# Altium schematic symbol library jlcpcb_2025_04_inductors_extended_0603.schlib: 1269 symbols (part 7 of 7) (continued)
## VHF160808H8N2ST
designator L?  Inductance: 8.2nH
Inductor, 8.2nH, 350mΩ, 400mA, SMD 0603; Manufacturer: FH(Guangdong Fenghua Advanced Tech); Manufacturer Part Number: VHF160808H8N2ST; Package Size: 0603; JLCPCB Basic Part: No; JLCPCB Part Number: C139273; Supplier 1: LCSC; Category: Inductors; Supplier Part Number 1: C139273; Rated Current: 400mA; DC Resistance: 350mΩ; RoHS: Yes; ComponentLink1Description: Datasheet; ComponentLink1URL: https://wmsc.lcsc.com/wmsc/upload/file/pdf/v2/lcsc/2302231230_FH--Guangdong-Fenghua-Advanced-Tech-VHF160808H8N2ST_C139273.pdf; ComponentLink2Description: JLCPCB Part URL; ComponentLink2URL: https://jlcpcb.com/partdetail/C139273; ComponentLink3Description: LCSC Part URL; ComponentLink3URL: https://lcsc.com/product-detail/Inductors-SMD_FH-Guangdong-Fenghua-Advanced-Tech-FH-Guangdong-Fenghua-Advanced-Tech-VHF160808H8N2ST_C139273.html
footprint IND-0603 (0603 (1608M) Inductor)
pins: 1, 2

## VHF160808H9N1JT
designator L?  Inductance: 9.1nH
Inductor, 9.1nH, ±5%, SMD 0603; Manufacturer: FH(Guangdong Fenghua Advanced Tech); Manufacturer Part Number: VHF160808H9N1JT; Package Size: 0603; JLCPCB Basic Part: No; JLCPCB Part Number: C395094; Supplier 1: LCSC; Category: Inductors; Supplier Part Number 1: C395094; Tolerance: ±5%; RoHS: Yes; ComponentLink1Description: Datasheet; ComponentLink1URL: https://wmsc.lcsc.com/wmsc/upload/file/pdf/v2/lcsc/2302231208_FH--Guangdong-Fenghua-Advanced-Tech-VHF160808H9N1JT_C395094.pdf; ComponentLink2Description: JLCPCB Part URL; ComponentLink2URL: https://jlcpcb.com/partdetail/C395094; ComponentLink3Description: LCSC Part URL; ComponentLink3URL: https://lcsc.com/product-detail/Inductors-SMD_FH-Guangdong-Fenghua-Advanced-Tech-FH-Guangdong-Fenghua-Advanced-Tech-VHF160808H9N1JT_C395094.html
footprint IND-0603 (0603 (1608M) Inductor)
pins: 1, 2

## VHF160808H10NJT
designator L?  Inductance: 10nH
Inductor, 10nH, ±5%, 400mΩ, 300mA, SMD 0603; Manufacturer: FH(Guangdong Fenghua Advanced Tech); Manufacturer Part Number: VHF160808H10NJT; Package Size: 0603; JLCPCB Basic Part: No; JLCPCB Part Number: C90205; Supplier 1: LCSC; Category: Inductors; Supplier Part Number 1: C90205; Tolerance: ±5%; Rated Current: 300mA; DC Resistance: 400mΩ; RoHS: Yes; ComponentLink1Description: Datasheet; ComponentLink1URL: https://wmsc.lcsc.com/wmsc/upload/file/pdf/v2/lcsc/2302231230_FH--Guangdong-Fenghua-Advanced-Tech-VHF160808H10NJT_C90205.pdf; ComponentLink2Description: JLCPCB Part URL; ComponentLink2URL: https://jlcpcb.com/partdetail/C90205; ComponentLink3Description: LCSC Part URL; ComponentLink3URL: https://lcsc.com/product-detail/Inductors-SMD_FH-Guangdong-Fenghua-Advanced-Tech-FH-Guangdong-Fenghua-Advanced-Tech-VHF160808H10NJT_C90205.html
footprint IND-0603 (0603 (1608M) Inductor)
pins: 1, 2

## VHF160808H12NJT
designator L?  Inductance: 12nH
Inductor, 12nH, ±5%, 400mΩ, 300mA, SMD 0603; Manufacturer: FH(Guangdong Fenghua Advanced Tech); Manufacturer Part Number: VHF160808H12NJT; Package Size: 0603; JLCPCB Basic Part: No; JLCPCB Part Number: C75656; Supplier 1: LCSC; Category: Inductors; Supplier Part Number 1: C75656; Tolerance: ±5%; Rated Current: 300mA; DC Resistance: 400mΩ; RoHS: Yes; ComponentLink1Description: Datasheet; ComponentLink1URL: https://wmsc.lcsc.com/wmsc/upload/file/pdf/v2/lcsc/2302231101_FH--Guangdong-Fenghua-Advanced-Tech-VHF160808H12NJT_C75656.pdf; ComponentLink2Description: JLCPCB Part URL; ComponentLink2URL: https://jlcpcb.com/partdetail/C75656; ComponentLink3Description: LCSC Part URL; ComponentLink3URL: https://lcsc.com/product-detail/Inductors-SMD_FH-Guangdong-Fenghua-Advanced-Tech-FH-Guangdong-Fenghua-Advanced-Tech-VHF160808H12NJT_C75656.html
footprint IND-0603 (0603 (1608M) Inductor)
pins: 1, 2

## VHF160808H15NJT
designator L?  Inductance: 15nH
Inductor, 15nH, ±5%, 450mΩ, 300mA, SMD 0603; Manufacturer: FH(Guangdong Fenghua Advanced Tech); Manufacturer Part Number: VHF160808H15NJT; Package Size: 0603; JLCPCB Basic Part: No; JLCPCB Part Number: C42028; Supplier 1: LCSC; Category: Inductors; Supplier Part Number 1: C42028; Tolerance: ±5%; Rated Current: 300mA; DC Resistance: 450mΩ; RoHS: Yes; ComponentLink1Description: Datasheet; ComponentLink1URL: https://wmsc.lcsc.com/wmsc/upload/file/pdf/v2/lcsc/2302231300_FH--Guangdong-Fenghua-Advanced-Tech-VHF160808H15NJT_C42028.pdf; ComponentLink2Description: JLCPCB Part URL; ComponentLink2URL: https://jlcpcb.com/partdetail/C42028; ComponentLink3Description: LCSC Part URL; ComponentLink3URL: https://lcsc.com/product-detail/Inductors-SMD_FH-Guangdong-Fenghua-Advanced-Tech-FH-Guangdong-Fenghua-Advanced-Tech-VHF160808H15NJT_C42028.html
footprint IND-0603 (0603 (1608M) Inductor)
pins: 1, 2

## VHF160808H18NJT
designator L?  Inductance: 18nH
Inductor, 18nH, ±5%, 600mΩ, 300mA, SMD 0603; Manufacturer: FH(Guangdong Fenghua Advanced Tech); Manufacturer Part Number: VHF160808H18NJT; Package Size: 0603; JLCPCB Basic Part: No; JLCPCB Part Number: C90206; Supplier 1: LCSC; Category: Inductors; Supplier Part Number 1: C90206; Tolerance: ±5%; Rated Current: 300mA; DC Resistance: 600mΩ; RoHS: Yes; ComponentLink1Description: Datasheet; ComponentLink1URL: https://wmsc.lcsc.com/wmsc/upload/file/pdf/v2/lcsc/2302231230_FH--Guangdong-Fenghua-Advanced-Tech-VHF160808H18NJT_C90206.pdf; ComponentLink2Description: JLCPCB Part URL; ComponentLink2URL: https://jlcpcb.com/partdetail/C90206; ComponentLink3Description: LCSC Part URL; ComponentLink3URL: https://lcsc.com/product-detail/Inductors-SMD_FH-Guangdong-Fenghua-Advanced-Tech-FH-Guangdong-Fenghua-Advanced-Tech-VHF160808H18NJT_C90206.html
footprint IND-0603 (0603 (1608M) Inductor)
pins: 1, 2

## VHF160808H20NJT
designator L?  Inductance: 20nH
Inductor, 20nH, ±5%, 300mA, SMD 0603; Manufacturer: FH (Guangdong Fenghua Advanced Tech); Manufacturer Part Number: VHF160808H20NJT; Package Size: 0603; JLCPCB Basic Part: No; JLCPCB Part Number: C395080; Supplier 1: LCSC; Category: Inductors; Supplier Part Number 1: C395080; Tolerance: ±5%; Rated Current: 300mA; RoHS: Yes; ComponentLink1Description: Datasheet; ComponentLink1URL: https://wmsc.lcsc.com/wmsc/upload/file/pdf/v2/lcsc/2302231208_FH--Guangdong-Fenghua-Advanced-Tech-VHF160808H20NJT_C395080.pdf; ComponentLink2Description: JLCPCB Part URL; ComponentLink2URL: https://jlcpcb.com/partdetail/C395080; ComponentLink3Description: LCSC Part URL; ComponentLink3URL: https://lcsc.com/product-detail/Inductors-SMD_FH-Guangdong-Fenghua-Advanced-Tech-FH-Guangdong-Fenghua-Advanced-Tech-VHF160808H20NJT_C395080.html
footprint IND-0603 (0603 (1608M) Inductor)
pins: 1, 2

## VHF160808H22NJT
designator L?  Inductance: 22nH
Inductor, 22nH, ±5%, 600mΩ, 300mA, SMD 0603; Manufacturer: FH(Guangdong Fenghua Advanced Tech); Manufacturer Part Number: VHF160808H22NJT; Package Size: 0603; JLCPCB Basic Part: No; JLCPCB Part Number: C90207; Supplier 1: LCSC; Category: Inductors; Supplier Part Number 1: C90207; Tolerance: ±5%; Rated Current: 300mA; DC Resistance: 600mΩ; RoHS: Yes; ComponentLink1Description: Datasheet; ComponentLink1URL: https://wmsc.lcsc.com/wmsc/upload/file/pdf/v2/lcsc/2302231230_FH--Guangdong-Fenghua-Advanced-Tech-VHF160808H22NJT_C90207.pdf; ComponentLink2Description: JLCPCB Part URL; ComponentLink2URL: https://jlcpcb.com/partdetail/C90207; ComponentLink3Description: LCSC Part URL; ComponentLink3URL: https://lcsc.com/product-detail/Inductors-SMD_FH-Guangdong-Fenghua-Advanced-Tech-FH-Guangdong-Fenghua-Advanced-Tech-VHF160808H22NJT_C90207.html
footprint IND-0603 (0603 (1608M) Inductor)
pins: 1, 2

## VHF160808H24NJT
designator L?  Inductance: 24nH
Inductor, 24nH, ±5%, SMD 0603; Manufacturer: FH(Guangdong Fenghua Advanced Tech); Manufacturer Part Number: VHF160808H24NJT; Package Size: 0603; JLCPCB Basic Part: No; JLCPCB Part Number: C139271; Supplier 1: LCSC; Category: Inductors; Supplier Part Number 1: C139271; Tolerance: ±5%; RoHS: Yes; ComponentLink1Description: Datasheet; ComponentLink1URL: https://wmsc.lcsc.com/wmsc/upload/file/pdf/v2/lcsc/2302231230_FH--Guangdong-Fenghua-Advanced-Tech-VHF160808H24NJT_C139271.pdf; ComponentLink2Description: JLCPCB Part URL; ComponentLink2URL: https://jlcpcb.com/partdetail/C139271; ComponentLink3Description: LCSC Part URL; ComponentLink3URL: https://lcsc.com/product-detail/Inductors-SMD_FH-Guangdong-Fenghua-Advanced-Tech-FH-Guangdong-Fenghua-Advanced-Tech-VHF160808H24NJT_C139271.html
footprint IND-0603 (0603 (1608M) Inductor)
pins: 1, 2

## VHF160808H27NJT
designator L?  Inductance: 27nH
Inductor, 27nH, ±5%, 800mΩ, 300mA, SMD 0603; Manufacturer: FH(Guangdong Fenghua Advanced Tech); Manufacturer Part Number: VHF160808H27NJT; Package Size: 0603; JLCPCB Basic Part: No; JLCPCB Part Number: C90208; Supplier 1: LCSC; Category: Inductors; Supplier Part Number 1: C90208; Tolerance: ±5%; Rated Current: 300mA; DC Resistance: 800mΩ; RoHS: Yes; ComponentLink1Description: Datasheet; ComponentLink1URL: https://wmsc.lcsc.com/wmsc/upload/file/pdf/v2/lcsc/2302231230_FH--Guangdong-Fenghua-Advanced-Tech-VHF160808H27NJT_C90208.pdf; ComponentLink2Description: JLCPCB Part URL; ComponentLink2URL: https://jlcpcb.com/partdetail/C90208; ComponentLink3Description: LCSC Part URL; ComponentLink3URL: https://lcsc.com/product-detail/Inductors-SMD_FH-Guangdong-Fenghua-Advanced-Tech-FH-Guangdong-Fenghua-Advanced-Tech-VHF160808H27NJT_C90208.html
footprint IND-0603 (0603 (1608M) Inductor)
pins: 1, 2

## VHF160808H30NJT
designator L?  Inductance: 30nH
Inductor, 30nH, ±5%, 300mA, SMD 0603; Manufacturer: FH (Guangdong Fenghua Advanced Tech); Manufacturer Part Number: VHF160808H30NJT; Package Size: 0603; JLCPCB Basic Part: No; JLCPCB Part Number: C395083; Supplier 1: LCSC; Category: Inductors; Supplier Part Number 1: C395083; Tolerance: ±5%; Rated Current: 300mA; RoHS: Yes; ComponentLink1Description: Datasheet; ComponentLink1URL: https://wmsc.lcsc.com/wmsc/upload/file/pdf/v2/lcsc/2302231208_FH--Guangdong-Fenghua-Advanced-Tech-VHF160808H30NJT_C395083.pdf; ComponentLink2Description: JLCPCB Part URL; ComponentLink2URL: https://jlcpcb.com/partdetail/C395083; ComponentLink3Description: LCSC Part URL; ComponentLink3URL: https://lcsc.com/product-detail/Inductors-SMD_FH-Guangdong-Fenghua-Advanced-Tech-FH-Guangdong-Fenghua-Advanced-Tech-VHF160808H30NJT_C395083.html
footprint IND-0603 (0603 (1608M) Inductor)
pins: 1, 2

## VHF160808H33NJT
designator L?  Inductance: 33nH
Inductor, 33nH, ±5%, 800mΩ, 300mA, SMD 0603; Manufacturer: FH(Guangdong Fenghua Advanced Tech); Manufacturer Part Number: VHF160808H33NJT; Package Size: 0603; JLCPCB Basic Part: No; JLCPCB Part Number: C90209; Supplier 1: LCSC; Category: Inductors; Supplier Part Number 1: C90209; Tolerance: ±5%; Rated Current: 300mA; DC Resistance: 800mΩ; RoHS: Yes; ComponentLink1Description: Datasheet; ComponentLink1URL: https://wmsc.lcsc.com/wmsc/upload/file/pdf/v2/lcsc/2302231230_FH--Guangdong-Fenghua-Advanced-Tech-VHF160808H33NJT_C90209.pdf; ComponentLink2Description: JLCPCB Part URL; ComponentLink2URL: https://jlcpcb.com/partdetail/C90209; ComponentLink3Description: LCSC Part URL; ComponentLink3URL: https://lcsc.com/product-detail/Inductors-SMD_FH-Guangdong-Fenghua-Advanced-Tech-FH-Guangdong-Fenghua-Advanced-Tech-VHF160808H33NJT_C90209.html
footprint IND-0603 (0603 (1608M) Inductor)
pins: 1, 2

## VHF160808H36NJT
designator L?  Inductance: 36nH
Inductor, 36nH, ±5%, SMD 0603; Manufacturer: FH(Guangdong Fenghua Advanced Tech); Manufacturer Part Number: VHF160808H36NJT; Package Size: 0603; JLCPCB Basic Part: No; JLCPCB Part Number: C395084; Supplier 1: LCSC; Category: Inductors; Supplier Part Number 1: C395084; Tolerance: ±5%; RoHS: Yes; ComponentLink1Description: Datasheet; ComponentLink1URL: https://wmsc.lcsc.com/wmsc/upload/file/pdf/v2/lcsc/2302231208_FH--Guangdong-Fenghua-Advanced-Tech-VHF160808H36NJT_C395084.pdf; ComponentLink2Description: JLCPCB Part URL; ComponentLink2URL: https://jlcpcb.com/partdetail/C395084; ComponentLink3Description: LCSC Part URL; ComponentLink3URL: https://lcsc.com/product-detail/Inductors-SMD_FH-Guangdong-Fenghua-Advanced-Tech-FH-Guangdong-Fenghua-Advanced-Tech-VHF160808H36NJT_C395084.html
footprint IND-0603 (0603 (1608M) Inductor)
pins: 1, 2

## VHF160808H39NJT
designator L?  Inductance: 39nH
Inductor, 39nH, ±5%, 1Ω, 300mA, SMD 0603; Manufacturer: FH(Guangdong Fenghua Advanced Tech); Manufacturer Part Number: VHF160808H39NJT; Package Size: 0603; JLCPCB Basic Part: No; JLCPCB Part Number: C75654; Supplier 1: LCSC; Category: Inductors; Supplier Part Number 1: C75654; Tolerance: ±5%; Rated Current: 300mA; DC Resistance: 1Ω; RoHS: Yes; ComponentLink1Description: Datasheet; ComponentLink1URL: https://wmsc.lcsc.com/wmsc/upload/file/pdf/v2/lcsc/2302231101_FH--Guangdong-Fenghua-Advanced-Tech-VHF160808H39NJT_C75654.pdf; ComponentLink2Description: JLCPCB Part URL; ComponentLink2URL: https://jlcpcb.com/partdetail/C75654; ComponentLink3Description: LCSC Part URL; ComponentLink3URL: https://lcsc.com/product-detail/Inductors-SMD_FH-Guangdong-Fenghua-Advanced-Tech-FH-Guangdong-Fenghua-Advanced-Tech-VHF160808H39NJT_C75654.html
footprint IND-0603 (0603 (1608M) Inductor)
pins: 1, 2

## VHF160808H43NJT
designator L?  Inductance: 43nH
Inductor, 43nH, ±5%, 200mA, SMD 0603; Manufacturer: FH (Guangdong Fenghua Advanced Tech); Manufacturer Part Number: VHF160808H43NJT; Package Size: 0603; JLCPCB Basic Part: No; JLCPCB Part Number: C395087; Supplier 1: LCSC; Category: Inductors; Supplier Part Number 1: C395087; Tolerance: ±5%; Rated Current: 200mA; RoHS: Yes; ComponentLink1Description: Datasheet; ComponentLink1URL: https://wmsc.lcsc.com/wmsc/upload/file/pdf/v2/lcsc/2302231208_FH--Guangdong-Fenghua-Advanced-Tech-VHF160808H43NJT_C395087.pdf; ComponentLink2Description: JLCPCB Part URL; ComponentLink2URL: https://jlcpcb.com/partdetail/C395087; ComponentLink3Description: LCSC Part URL; ComponentLink3URL: https://lcsc.com/product-detail/Inductors-SMD_FH-Guangdong-Fenghua-Advanced-Tech-FH-Guangdong-Fenghua-Advanced-Tech-VHF160808H43NJT_C395087.html
footprint IND-0603 (0603 (1608M) Inductor)
pins: 1, 2

## VHF160808H47NJT
designator L?  Inductance: 47nH
Inductor, 47nH, ±5%, 1Ω, 200mA, SMD 0603; Manufacturer: FH(Guangdong Fenghua Advanced Tech); Manufacturer Part Number: VHF160808H47NJT; Package Size: 0603; JLCPCB Basic Part: No; JLCPCB Part Number: C90210; Supplier 1: LCSC; Category: Inductors; Supplier Part Number 1: C90210; Tolerance: ±5%; Rated Current: 200mA; DC Resistance: 1Ω; RoHS: Yes; ComponentLink1Description: Datasheet; ComponentLink1URL: https://wmsc.lcsc.com/wmsc/upload/file/pdf/v2/lcsc/2302231230_FH--Guangdong-Fenghua-Advanced-Tech-VHF160808H47NJT_C90210.pdf; ComponentLink2Description: JLCPCB Part URL; ComponentLink2URL: https://jlcpcb.com/partdetail/C90210; ComponentLink3Description: LCSC Part URL; ComponentLink3URL: https://lcsc.com/product-detail/Inductors-SMD_FH-Guangdong-Fenghua-Advanced-Tech-FH-Guangdong-Fenghua-Advanced-Tech-VHF160808H47NJT_C90210.html
footprint IND-0603 (0603 (1608M) Inductor)
pins: 1, 2

## VHF160808H51NJT
designator L?  Inductance: 51nH
Inductor, 51nH, ±5%, SMD 0603; Manufacturer: FH (Guangdong Fenghua Advanced Tech); Manufacturer Part Number: VHF160808H51NJT; Package Size: 0603; JLCPCB Basic Part: No; JLCPCB Part Number: C2991178; Supplier 1: LCSC; Category: Inductors; Supplier Part Number 1: C2991178; Tolerance: ±5%; RoHS: Yes; ComponentLink1Description: Datasheet; ComponentLink1URL: https://wmsc.lcsc.com/wmsc/upload/file/pdf/v2/lcsc/2302231130_FH--Guangdong-Fenghua-Advanced-Tech-VHF160808H51NJT_C2991178.pdf; ComponentLink2Description: JLCPCB Part URL; ComponentLink2URL: https://jlcpcb.com/partdetail/C2991178; ComponentLink3Description: LCSC Part URL; ComponentLink3URL: https://lcsc.com/product-detail/Inductors-SMD_FH-Guangdong-Fenghua-Advanced-Tech-FH-Guangdong-Fenghua-Advanced-Tech-VHF160808H51NJT_C2991178.html
footprint IND-0603 (0603 (1608M) Inductor)
pins: 1, 2

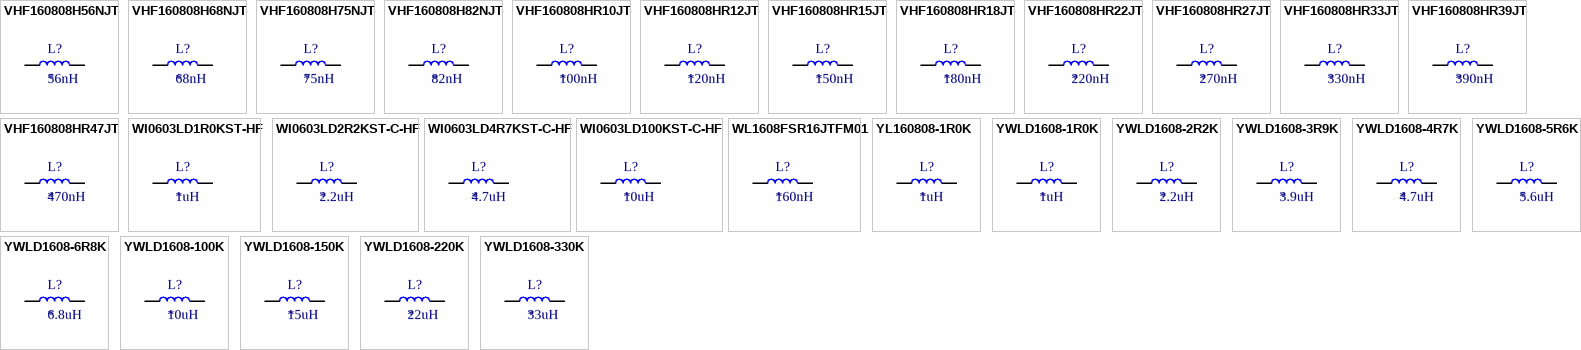
[diagram p31: symbols VHF160808H56NJT to YWLD1608-330K]

## VHF160808H56NJT
designator L?  Inductance: 56nH
Inductor, 56nH, ±5%, 1Ω, 200mA, SMD 0603; Manufacturer: FH(Guangdong Fenghua Advanced Tech); Manufacturer Part Number: VHF160808H56NJT; Package Size: 0603; JLCPCB Basic Part: No; JLCPCB Part Number: C90211; Supplier 1: LCSC; Category: Inductors; Supplier Part Number 1: C90211; Tolerance: ±5%; Rated Current: 200mA; DC Resistance: 1Ω; RoHS: Yes; ComponentLink1Description: Datasheet; ComponentLink1URL: https://wmsc.lcsc.com/wmsc/upload/file/pdf/v2/lcsc/2302231230_FH--Guangdong-Fenghua-Advanced-Tech-VHF160808H56NJT_C90211.pdf; ComponentLink2Description: JLCPCB Part URL; ComponentLink2URL: https://jlcpcb.com/partdetail/C90211; ComponentLink3Description: LCSC Part URL; ComponentLink3URL: https://lcsc.com/product-detail/Inductors-SMD_FH-Guangdong-Fenghua-Advanced-Tech-FH-Guangdong-Fenghua-Advanced-Tech-VHF160808H56NJT_C90211.html
footprint IND-0603 (0603 (1608M) Inductor)
pins: 1, 2

## VHF160808H68NJT
designator L?  Inductance: 68nH
Inductor, 68nH, ±5%, 1Ω, 200mA, SMD 0603; Manufacturer: FH(Guangdong Fenghua Advanced Tech); Manufacturer Part Number: VHF160808H68NJT; Package Size: 0603; JLCPCB Basic Part: No; JLCPCB Part Number: C90212; Supplier 1: LCSC; Category: Inductors; Supplier Part Number 1: C90212; Tolerance: ±5%; Rated Current: 200mA; DC Resistance: 1Ω; RoHS: Yes; ComponentLink1Description: Datasheet; ComponentLink1URL: https://wmsc.lcsc.com/wmsc/upload/file/pdf/v2/lcsc/2302231230_FH--Guangdong-Fenghua-Advanced-Tech-VHF160808H68NJT_C90212.pdf; ComponentLink2Description: JLCPCB Part URL; ComponentLink2URL: https://jlcpcb.com/partdetail/C90212; ComponentLink3Description: LCSC Part URL; ComponentLink3URL: https://lcsc.com/product-detail/Inductors-SMD_FH-Guangdong-Fenghua-Advanced-Tech-FH-Guangdong-Fenghua-Advanced-Tech-VHF160808H68NJT_C90212.html
footprint IND-0603 (0603 (1608M) Inductor)
pins: 1, 2

## VHF160808H75NJT
designator L?  Inductance: 75nH
Inductor, 75nH, ±5%, SMD 0603; Manufacturer: FH(Guangdong Fenghua Advanced Tech); Manufacturer Part Number: VHF160808H75NJT; Package Size: 0603; JLCPCB Basic Part: No; JLCPCB Part Number: C395092; Supplier 1: LCSC; Category: Inductors; Supplier Part Number 1: C395092; Tolerance: ±5%; RoHS: Yes; ComponentLink1Description: Datasheet; ComponentLink1URL: https://wmsc.lcsc.com/wmsc/upload/file/pdf/v2/lcsc/2302231208_FH--Guangdong-Fenghua-Advanced-Tech-VHF160808H75NJT_C395092.pdf; ComponentLink2Description: JLCPCB Part URL; ComponentLink2URL: https://jlcpcb.com/partdetail/C395092; ComponentLink3Description: LCSC Part URL; ComponentLink3URL: https://lcsc.com/product-detail/Inductors-SMD_FH-Guangdong-Fenghua-Advanced-Tech-FH-Guangdong-Fenghua-Advanced-Tech-VHF160808H75NJT_C395092.html
footprint IND-0603 (0603 (1608M) Inductor)
pins: 1, 2

## VHF160808H82NJT
designator L?  Inductance: 82nH
Inductor, 82nH, ±5%, 1Ω, 200mA, SMD 0603; Manufacturer: FH(Guangdong Fenghua Advanced Tech); Manufacturer Part Number: VHF160808H82NJT; Package Size: 0603; JLCPCB Basic Part: No; JLCPCB Part Number: C90213; Supplier 1: LCSC; Category: Inductors; Supplier Part Number 1: C90213; Tolerance: ±5%; Rated Current: 200mA; DC Resistance: 1Ω; RoHS: Yes; ComponentLink1Description: Datasheet; ComponentLink1URL: https://wmsc.lcsc.com/wmsc/upload/file/pdf/v2/lcsc/2302231230_FH--Guangdong-Fenghua-Advanced-Tech-VHF160808H82NJT_C90213.pdf; ComponentLink2Description: JLCPCB Part URL; ComponentLink2URL: https://jlcpcb.com/partdetail/C90213; ComponentLink3Description: LCSC Part URL; ComponentLink3URL: https://lcsc.com/product-detail/Inductors-SMD_FH-Guangdong-Fenghua-Advanced-Tech-FH-Guangdong-Fenghua-Advanced-Tech-VHF160808H82NJT_C90213.html
footprint IND-0603 (0603 (1608M) Inductor)
pins: 1, 2

## VHF160808HR10JT
designator L?  Inductance: 100nH
Inductor, 100nH, ±5%, 1.4Ω, 200mA, SMD 0603; Manufacturer: FH(Guangdong Fenghua Advanced Tech); Manufacturer Part Number: VHF160808HR10JT; Package Size: 0603; JLCPCB Basic Part: No; JLCPCB Part Number: C90214; Supplier 1: LCSC; Category: Inductors; Supplier Part Number 1: C90214; Tolerance: ±5%; Rated Current: 200mA; DC Resistance: 1.4Ω; RoHS: Yes; ComponentLink1Description: Datasheet; ComponentLink1URL: https://wmsc.lcsc.com/wmsc/upload/file/pdf/v2/lcsc/2302231230_FH--Guangdong-Fenghua-Advanced-Tech-VHF160808HR10JT_C90214.pdf; ComponentLink2Description: JLCPCB Part URL; ComponentLink2URL: https://jlcpcb.com/partdetail/C90214; ComponentLink3Description: LCSC Part URL; ComponentLink3URL: https://lcsc.com/product-detail/Inductors-SMD_FH-Guangdong-Fenghua-Advanced-Tech-FH-Guangdong-Fenghua-Advanced-Tech-VHF160808HR10JT_C90214.html
footprint IND-0603 (0603 (1608M) Inductor)
pins: 1, 2

## VHF160808HR12JT
designator L?  Inductance: 120nH
Inductor, 120nH, ±5%, 1.6Ω, 150mA, SMD 0603; Manufacturer: FH(Guangdong Fenghua Advanced Tech); Manufacturer Part Number: VHF160808HR12JT; Package Size: 0603; JLCPCB Basic Part: No; JLCPCB Part Number: C90215; Supplier 1: LCSC; Category: Inductors; Supplier Part Number 1: C90215; Tolerance: ±5%; Rated Current: 150mA; DC Resistance: 1.6Ω; RoHS: Yes; ComponentLink1Description: Datasheet; ComponentLink1URL: https://wmsc.lcsc.com/wmsc/upload/file/pdf/v2/lcsc/2302231230_FH--Guangdong-Fenghua-Advanced-Tech-VHF160808HR12JT_C90215.pdf; ComponentLink2Description: JLCPCB Part URL; ComponentLink2URL: https://jlcpcb.com/partdetail/C90215; ComponentLink3Description: LCSC Part URL; ComponentLink3URL: https://lcsc.com/product-detail/Inductors-SMD_FH-Guangdong-Fenghua-Advanced-Tech-FH-Guangdong-Fenghua-Advanced-Tech-VHF160808HR12JT_C90215.html
footprint IND-0603 (0603 (1608M) Inductor)
pins: 1, 2

## VHF160808HR15JT
designator L?  Inductance: 150nH
Inductor, 150nH, ±5%, 1.8Ω, 150mA, SMD 0603; Manufacturer: FH(Guangdong Fenghua Advanced Tech); Manufacturer Part Number: VHF160808HR15JT; Package Size: 0603; JLCPCB Basic Part: No; JLCPCB Part Number: C90216; Supplier 1: LCSC; Category: Inductors; Supplier Part Number 1: C90216; Tolerance: ±5%; Rated Current: 150mA; DC Resistance: 1.8Ω; RoHS: Yes; ComponentLink1Description: Datasheet; ComponentLink1URL: https://wmsc.lcsc.com/wmsc/upload/file/pdf/v2/lcsc/2302231230_FH--Guangdong-Fenghua-Advanced-Tech-VHF160808HR15JT_C90216.pdf; ComponentLink2Description: JLCPCB Part URL; ComponentLink2URL: https://jlcpcb.com/partdetail/C90216; ComponentLink3Description: LCSC Part URL; ComponentLink3URL: https://lcsc.com/product-detail/Inductors-SMD_FH-Guangdong-Fenghua-Advanced-Tech-FH-Guangdong-Fenghua-Advanced-Tech-VHF160808HR15JT_C90216.html
footprint IND-0603 (0603 (1608M) Inductor)
pins: 1, 2

## VHF160808HR18JT
designator L?  Inductance: 180nH
Inductor, 180nH, ±5%, SMD 0603; Manufacturer: FH(Guangdong Fenghua Advanced Tech); Manufacturer Part Number: VHF160808HR18JT; Package Size: 0603; JLCPCB Basic Part: No; JLCPCB Part Number: C90217; Supplier 1: LCSC; Category: Inductors; Supplier Part Number 1: C90217; Tolerance: ±5%; RoHS: Yes; ComponentLink1Description: Datasheet; ComponentLink1URL: https://wmsc.lcsc.com/wmsc/upload/file/pdf/v2/lcsc/2302231230_FH--Guangdong-Fenghua-Advanced-Tech-VHF160808HR18JT_C90217.pdf; ComponentLink2Description: JLCPCB Part URL; ComponentLink2URL: https://jlcpcb.com/partdetail/C90217; ComponentLink3Description: LCSC Part URL; ComponentLink3URL: https://lcsc.com/product-detail/Inductors-SMD_FH-Guangdong-Fenghua-Advanced-Tech-FH-Guangdong-Fenghua-Advanced-Tech-VHF160808HR18JT_C90217.html
footprint IND-0603 (0603 (1608M) Inductor)
pins: 1, 2

## VHF160808HR22JT
designator L?  Inductance: 220nH
Inductor, 220nH, ±5%, 2.4Ω, 200mA, SMD 0603; Manufacturer: FH(Guangdong Fenghua Advanced Tech); Manufacturer Part Number: VHF160808HR22JT; Package Size: 0603; JLCPCB Basic Part: No; JLCPCB Part Number: C381900; Supplier 1: LCSC; Category: Inductors; Supplier Part Number 1: C381900; Tolerance: ±5%; Rated Current: 200mA; DC Resistance: 2.4Ω; RoHS: Yes; ComponentLink1Description: Datasheet; ComponentLink1URL: https://wmsc.lcsc.com/wmsc/upload/file/pdf/v2/lcsc/2302231208_FH--Guangdong-Fenghua-Advanced-Tech-VHF160808HR22JT_C381900.pdf; ComponentLink2Description: JLCPCB Part URL; ComponentLink2URL: https://jlcpcb.com/partdetail/C381900; ComponentLink3Description: LCSC Part URL; ComponentLink3URL: https://lcsc.com/product-detail/Inductors-SMD_FH-Guangdong-Fenghua-Advanced-Tech-FH-Guangdong-Fenghua-Advanced-Tech-VHF160808HR22JT_C381900.html
footprint IND-0603 (0603 (1608M) Inductor)
pins: 1, 2

## VHF160808HR27JT
designator L?  Inductance: 270nH
Inductor, 270nH, ±5%, 2.6Ω, 150mA, SMD 0603; Manufacturer: FH(Guangdong Fenghua Advanced Tech); Manufacturer Part Number: VHF160808HR27JT; Package Size: 0603; JLCPCB Basic Part: No; JLCPCB Part Number: C381901; Supplier 1: LCSC; Category: Inductors; Supplier Part Number 1: C381901; Tolerance: ±5%; Rated Current: 150mA; DC Resistance: 2.6Ω; RoHS: Yes; ComponentLink1Description: Datasheet; ComponentLink1URL: https://wmsc.lcsc.com/wmsc/upload/file/pdf/v2/lcsc/2302231208_FH--Guangdong-Fenghua-Advanced-Tech-VHF160808HR27JT_C381901.pdf; ComponentLink2Description: JLCPCB Part URL; ComponentLink2URL: https://jlcpcb.com/partdetail/C381901; ComponentLink3Description: LCSC Part URL; ComponentLink3URL: https://lcsc.com/product-detail/Inductors-SMD_FH-Guangdong-Fenghua-Advanced-Tech-FH-Guangdong-Fenghua-Advanced-Tech-VHF160808HR27JT_C381901.html
footprint IND-0603 (0603 (1608M) Inductor)
pins: 1, 2

## VHF160808HR33JT
designator L?  Inductance: 330nH
Inductor, 330nH, ±5%, 2.8Ω, 150mA, SMD 0603; Manufacturer: FH(Guangdong Fenghua Advanced Tech); Manufacturer Part Number: VHF160808HR33JT; Package Size: 0603; JLCPCB Basic Part: No; JLCPCB Part Number: C381902; Supplier 1: LCSC; Category: Inductors; Supplier Part Number 1: C381902; Tolerance: ±5%; Rated Current: 150mA; DC Resistance: 2.8Ω; RoHS: Yes; ComponentLink1Description: Datasheet; ComponentLink1URL: https://wmsc.lcsc.com/wmsc/upload/file/pdf/v2/lcsc/2302231208_FH--Guangdong-Fenghua-Advanced-Tech-VHF160808HR33JT_C381902.pdf; ComponentLink2Description: JLCPCB Part URL; ComponentLink2URL: https://jlcpcb.com/partdetail/C381902; ComponentLink3Description: LCSC Part URL; ComponentLink3URL: https://lcsc.com/product-detail/Inductors-SMD_FH-Guangdong-Fenghua-Advanced-Tech-FH-Guangdong-Fenghua-Advanced-Tech-VHF160808HR33JT_C381902.html
footprint IND-0603 (0603 (1608M) Inductor)
pins: 1, 2

## VHF160808HR39JT
designator L?  Inductance: 390nH
Inductor, 390nH, ±5%, 3.2Ω, 150mA, SMD 0603; Manufacturer: FH(Guangdong Fenghua Advanced Tech); Manufacturer Part Number: VHF160808HR39JT; Package Size: 0603; JLCPCB Basic Part: No; JLCPCB Part Number: C395095; Supplier 1: LCSC; Category: Inductors; Supplier Part Number 1: C395095; Tolerance: ±5%; Rated Current: 150mA; DC Resistance: 3.2Ω; RoHS: Yes; ComponentLink1Description: Datasheet; ComponentLink1URL: https://wmsc.lcsc.com/wmsc/upload/file/pdf/v2/lcsc/2302231208_FH--Guangdong-Fenghua-Advanced-Tech-VHF160808HR39JT_C395095.pdf; ComponentLink2Description: JLCPCB Part URL; ComponentLink2URL: https://jlcpcb.com/partdetail/C395095; ComponentLink3Description: LCSC Part URL; ComponentLink3URL: https://lcsc.com/product-detail/Inductors-SMD_FH-Guangdong-Fenghua-Advanced-Tech-FH-Guangdong-Fenghua-Advanced-Tech-VHF160808HR39JT_C395095.html
footprint IND-0603 (0603 (1608M) Inductor)
pins: 1, 2

## VHF160808HR47JT
designator L?  Inductance: 470nH
Inductor, 470nH, ±5%, 3.6Ω, 150mA, SMD 0603; Manufacturer: FH(Guangdong Fenghua Advanced Tech); Manufacturer Part Number: VHF160808HR47JT; Package Size: 0603; JLCPCB Basic Part: No; JLCPCB Part Number: C395096; Supplier 1: LCSC; Category: Inductors; Supplier Part Number 1: C395096; Tolerance: ±5%; Rated Current: 150mA; DC Resistance: 3.6Ω; RoHS: Yes; ComponentLink1Description: Datasheet; ComponentLink1URL: https://wmsc.lcsc.com/wmsc/upload/file/pdf/v2/lcsc/2302231208_FH--Guangdong-Fenghua-Advanced-Tech-VHF160808HR47JT_C395096.pdf; ComponentLink2Description: JLCPCB Part URL; ComponentLink2URL: https://jlcpcb.com/partdetail/C395096; ComponentLink3Description: LCSC Part URL; ComponentLink3URL: https://lcsc.com/product-detail/Inductors-SMD_FH-Guangdong-Fenghua-Advanced-Tech-FH-Guangdong-Fenghua-Advanced-Tech-VHF160808HR47JT_C395096.html
footprint IND-0603 (0603 (1608M) Inductor)
pins: 1, 2

## WI0603LD1R0KST-HF
designator L?  Inductance: 1uH
Inductor, 1uH, ±10%, 410mΩ, SMD 0603; Manufacturer: DDY; Manufacturer Part Number: WI0603LD1R0KST-HF; Self-Resonant Frequency: 250MHz; Q Factor: 16@7.9MHz; Package Size: 0603; JLCPCB Basic Part: No; JLCPCB Part Number: C2921052; Supplier 1: LCSC; Category: Inductors; Supplier Part Number 1: C2921052; Tolerance: ±10%; DC Resistance: 410mΩ; RoHS: Yes; ComponentLink1Description: Datasheet; ComponentLink1URL: https://wmsc.lcsc.com/wmsc/upload/file/pdf/v2/lcsc/2111172030_DDY-WI0603LD1R0KST-HF_C2921052.pdf; ComponentLink2Description: JLCPCB Part URL; ComponentLink2URL: https://jlcpcb.com/partdetail/C2921052; ComponentLink3Description: LCSC Part URL; ComponentLink3URL: https://lcsc.com/product-detail/Inductors-SMD_DDY-DDY-WI0603LD1R0KST-HF_C2921052.html
footprint IND-0603 (0603 (1608M) Inductor)
pins: 1, 2

## WI0603LD2R2KST-C-HF
designator L?  Inductance: 2.2uH
Inductor, 2.2uH, ±10%, 500mΩ, SMD 0603; Manufacturer: DDY; Manufacturer Part Number: WI0603LD2R2KST-C-HF; Self-Resonant Frequency: 103MHz; Q Factor: 16@7.9MHz; Package Size: 0603; JLCPCB Basic Part: No; JLCPCB Part Number: C2921053; Supplier 1: LCSC; Category: Inductors; Supplier Part Number 1: C2921053; Tolerance: ±10%; DC Resistance: 500mΩ; RoHS: Yes; ComponentLink1Description: Datasheet; ComponentLink1URL: https://wmsc.lcsc.com/wmsc/upload/file/pdf/v2/lcsc/2111172030_DDY-WI0603LD2R2KST-C-HF_C2921053.pdf; ComponentLink2Description: JLCPCB Part URL; ComponentLink2URL: https://jlcpcb.com/partdetail/C2921053; ComponentLink3Description: LCSC Part URL; ComponentLink3URL: https://lcsc.com/product-detail/Inductors-SMD_DDY-DDY-WI0603LD2R2KST-C-HF_C2921053.html
footprint IND-0603 (0603 (1608M) Inductor)
pins: 1, 2

## WI0603LD4R7KST-C-HF
designator L?  Inductance: 4.7uH
Inductor, 4.7uH, ±10%, 970mΩ, SMD 0603; Manufacturer: DDY; Manufacturer Part Number: WI0603LD4R7KST-C-HF; Self-Resonant Frequency: 51MHz; Q Factor: 16@7.9MHz; Package Size: 0603; JLCPCB Basic Part: No; JLCPCB Part Number: C2921054; Supplier 1: LCSC; Category: Inductors; Supplier Part Number 1: C2921054; Tolerance: ±10%; DC Resistance: 970mΩ; RoHS: Yes; ComponentLink1Description: Datasheet; ComponentLink1URL: https://wmsc.lcsc.com/wmsc/upload/file/pdf/v2/lcsc/2111172030_DDY-WI0603LD4R7KST-C-HF_C2921054.pdf; ComponentLink2Description: JLCPCB Part URL; ComponentLink2URL: https://jlcpcb.com/partdetail/C2921054; ComponentLink3Description: LCSC Part URL; ComponentLink3URL: https://lcsc.com/product-detail/Inductors-SMD_DDY-DDY-WI0603LD4R7KST-C-HF_C2921054.html
footprint IND-0603 (0603 (1608M) Inductor)
pins: 1, 2

## WI0603LD100KST-C-HF
designator L?  Inductance: 10uH
Inductor, 10uH, ±10%, 2.4Ω, SMD 0603; Manufacturer: DDY; Manufacturer Part Number: WI0603LD100KST-C-HF; Self-Resonant Frequency: 36MHz; Q Factor: 14@2.5MHz; Package Size: 0603; JLCPCB Basic Part: No; JLCPCB Part Number: C2921055; Supplier 1: LCSC; Category: Inductors; Supplier Part Number 1: C2921055; Tolerance: ±10%; DC Resistance: 2.4Ω; RoHS: Yes; ComponentLink1Description: Datasheet; ComponentLink1URL: https://wmsc.lcsc.com/wmsc/upload/file/pdf/v2/lcsc/2111172030_DDY-WI0603LD100KST-C-HF_C2921055.pdf; ComponentLink2Description: JLCPCB Part URL; ComponentLink2URL: https://jlcpcb.com/partdetail/C2921055; ComponentLink3Description: LCSC Part URL; ComponentLink3URL: https://lcsc.com/product-detail/Inductors-SMD_DDY-DDY-WI0603LD100KST-C-HF_C2921055.html
footprint IND-0603 (0603 (1608M) Inductor)
pins: 1, 2

## WL1608FSR16JTFM01
designator L?  Inductance: 160nH
Inductor, 160nH, ±5%, 100mΩ, 1A, SMD 0603; Manufacturer: Sunlord; Manufacturer Part Number: WL1608FSR16JTFM01; Self-Resonant Frequency: 10MHz; Package Size: 0603; JLCPCB Basic Part: No; JLCPCB Part Number: C279869; Supplier 1: LCSC; Category: Inductors; Supplier Part Number 1: C279869; Tolerance: ±5%; Rated Current: 1A; DC Resistance: 100mΩ; RoHS: Yes; ComponentLink1Description: Datasheet; ComponentLink1URL: https://wmsc.lcsc.com/wmsc/upload/file/pdf/v2/lcsc/2110092130_Sunlord-WL1608FSR16JTFM01_C279869.pdf; ComponentLink2Description: JLCPCB Part URL; ComponentLink2URL: https://jlcpcb.com/partdetail/C279869; ComponentLink3Description: LCSC Part URL; ComponentLink3URL: https://lcsc.com/product-detail/Inductors-SMD_Sunlord-Sunlord-WL1608FSR16JTFM01_C279869.html
footprint IND-0603 (0603 (1608M) Inductor)
pins: 1, 2

## YL160808-1R0K
designator L?  Inductance: 1uH
Inductor, 1uH, ±10%, 600mΩ, 25mA, SMD 0603; Manufacturer: YJYCOIN; Manufacturer Part Number: YL160808-1R0K; Self-Resonant Frequency: 75MHz; Q Factor: 35@10MHz; Package Size: 0603; JLCPCB Basic Part: No; JLCPCB Part Number: C2839970; Supplier 1: LCSC; Category: Inductors; Supplier Part Number 1: C2839970; Tolerance: ±10%; Rated Current: 25mA; DC Resistance: 600mΩ; RoHS: Yes; ComponentLink1Description: Datasheet; ComponentLink1URL: https://wmsc.lcsc.com/wmsc/upload/file/pdf/v2/lcsc/2202132000_YJYCOIN-YL160808-1R0K_C2839970.pdf; ComponentLink2Description: JLCPCB Part URL; ComponentLink2URL: https://jlcpcb.com/partdetail/C2839970; ComponentLink3Description: LCSC Part URL; ComponentLink3URL: https://lcsc.com/product-detail/Inductors-SMD_YJYCOIN-YJYCOIN-YL160808-1R0K_C2839970.html
footprint IND-0603 (0603 (1608M) Inductor)
pins: 1, 2

## YWLD1608-1R0K
designator L?  Inductance: 1uH
Inductor, 1uH, ±10%, 0.41Ω, 700mA, SMD 0603; Manufacturer: YJYCOIN; Manufacturer Part Number: YWLD1608-1R0K; Self-Resonant Frequency: 250MHz; Package Size: 0603; JLCPCB Basic Part: No; JLCPCB Part Number: C5339199; Supplier 1: LCSC; Category: Inductors; Supplier Part Number 1: C5339199; Tolerance: ±10%; Rated Current: 700mA; DC Resistance: 0.41Ω; RoHS: Yes; ComponentLink1Description: Datasheet; ComponentLink1URL: https://wmsc.lcsc.com/wmsc/upload/file/pdf/v2/lcsc/2212271230_YJYCOIN-YWLD1608-1R0K_C5339199.pdf; ComponentLink2Description: JLCPCB Part URL; ComponentLink2URL: https://jlcpcb.com/partdetail/C5339199; ComponentLink3Description: LCSC Part URL; ComponentLink3URL: https://lcsc.com/product-detail/Inductors-SMD_YJYCOIN-YJYCOIN-YWLD1608-1R0K_C5339199.html
footprint IND-0603 (0603 (1608M) Inductor)
pins: 1, 2

## YWLD1608-2R2K
designator L?  Inductance: 2.2uH
Inductor, 2.2uH, ±10%, 0.72Ω, 580mA, SMD 0603; Manufacturer: YJYCOIN; Manufacturer Part Number: YWLD1608-2R2K; Self-Resonant Frequency: 103MHz; Q Factor: 16@7.9MHz; Package Size: 0603; JLCPCB Basic Part: No; JLCPCB Part Number: C5339202; Supplier 1: LCSC; Category: Inductors; Supplier Part Number 1: C5339202; Tolerance: ±10%; Rated Current: 580mA; DC Resistance: 0.72Ω; RoHS: Yes; ComponentLink1Description: Datasheet; ComponentLink1URL: https://wmsc.lcsc.com/wmsc/upload/file/pdf/v2/lcsc/2212271430_YJYCOIN-YWLD1608-2R2K_C5339202.pdf; ComponentLink2Description: JLCPCB Part URL; ComponentLink2URL: https://jlcpcb.com/partdetail/C5339202; ComponentLink3Description: LCSC Part URL; ComponentLink3URL: https://lcsc.com/product-detail/Inductors-SMD_YJYCOIN-YJYCOIN-YWLD1608-2R2K_C5339202.html
footprint IND-0603 (0603 (1608M) Inductor)
pins: 1, 2

## YWLD1608-3R9K
designator L?  Inductance: 3.9uH
Inductor, 3.9uH, ±10%, 1.08Ω, 460mA, SMD 0603; Manufacturer: YJYCOIN; Manufacturer Part Number: YWLD1608-3R9K; Self-Resonant Frequency: 61MHz; Q Factor: 16@7.9MHz; Package Size: 0603; JLCPCB Basic Part: No; JLCPCB Part Number: C5339204; Supplier 1: LCSC; Category: Inductors; Supplier Part Number 1: C5339204; Tolerance: ±10%; Rated Current: 460mA; DC Resistance: 1.08Ω; RoHS: Yes; ComponentLink1Description: Datasheet; ComponentLink1URL: https://wmsc.lcsc.com/wmsc/upload/file/pdf/v2/lcsc/2212271430_YJYCOIN-YWLD1608-3R9K_C5339204.pdf; ComponentLink2Description: JLCPCB Part URL; ComponentLink2URL: https://jlcpcb.com/partdetail/C5339204; ComponentLink3Description: LCSC Part URL; ComponentLink3URL: https://lcsc.com/product-detail/Inductors-SMD_YJYCOIN-YJYCOIN-YWLD1608-3R9K_C5339204.html
footprint IND-0603 (0603 (1608M) Inductor)
pins: 1, 2

## YWLD1608-4R7K
designator L?  Inductance: 4.7uH
Inductor, 4.7uH, ±10%, 970mΩ, 420mA, SMD 0603; Manufacturer: YJYCOIN; Manufacturer Part Number: YWLD1608-4R7K; Self-Resonant Frequency: 51MHz; Q Factor: 16@7.9MHz; Package Size: 0603; JLCPCB Basic Part: No; JLCPCB Part Number: C5339205; Supplier 1: LCSC; Category: Inductors; Supplier Part Number 1: C5339205; Tolerance: ±10%; Rated Current: 420mA; DC Resistance: 970mΩ; RoHS: Yes; ComponentLink1Description: Datasheet; ComponentLink1URL: https://wmsc.lcsc.com/wmsc/upload/file/pdf/v2/lcsc/2212271430_YJYCOIN-YWLD1608-4R7K_C5339205.pdf; ComponentLink2Description: JLCPCB Part URL; ComponentLink2URL: https://jlcpcb.com/partdetail/C5339205; ComponentLink3Description: LCSC Part URL; ComponentLink3URL: https://lcsc.com/product-detail/Inductors-SMD_YJYCOIN-YJYCOIN-YWLD1608-4R7K_C5339205.html
footprint IND-0603 (0603 (1608M) Inductor)
pins: 1, 2

## YWLD1608-5R6K
designator L?  Inductance: 5.6uH
Inductor, 5.6uH, ±10%, 1.43Ω, 380mA, SMD 0603; Manufacturer: YJYCOIN; Manufacturer Part Number: YWLD1608-5R6K; Self-Resonant Frequency: 47MHz; Q Factor: 16@7.9MHz; Package Size: 0603; JLCPCB Basic Part: No; JLCPCB Part Number: C5339206; Supplier 1: LCSC; Category: Inductors; Supplier Part Number 1: C5339206; Tolerance: ±10%; Rated Current: 380mA; DC Resistance: 1.43Ω; RoHS: Yes; ComponentLink1Description: Datasheet; ComponentLink1URL: https://wmsc.lcsc.com/wmsc/upload/file/pdf/v2/lcsc/2212271430_YJYCOIN-YWLD1608-5R6K_C5339206.pdf; ComponentLink2Description: JLCPCB Part URL; ComponentLink2URL: https://jlcpcb.com/partdetail/C5339206; ComponentLink3Description: LCSC Part URL; ComponentLink3URL: https://lcsc.com/product-detail/Inductors-SMD_YJYCOIN-YJYCOIN-YWLD1608-5R6K_C5339206.html
footprint IND-0603 (0603 (1608M) Inductor)
pins: 1, 2

## YWLD1608-6R8K
designator L?  Inductance: 6.8uH
Inductor, 6.8uH, ±10%, 1.95Ω, 340mA, SMD 0603; Manufacturer: YJYCOIN; Manufacturer Part Number: YWLD1608-6R8K; Self-Resonant Frequency: 43MHz; Q Factor: 16@7.9MHz; Package Size: 0603; JLCPCB Basic Part: No; JLCPCB Part Number: C5339207; Supplier 1: LCSC; Category: Inductors; Supplier Part Number 1: C5339207; Tolerance: ±10%; Rated Current: 340mA; DC Resistance: 1.95Ω; RoHS: Yes; ComponentLink1Description: Datasheet; ComponentLink1URL: https://wmsc.lcsc.com/wmsc/upload/file/pdf/v2/lcsc/2212271430_YJYCOIN-YWLD1608-6R8K_C5339207.pdf; ComponentLink2Description: JLCPCB Part URL; ComponentLink2URL: https://jlcpcb.com/partdetail/C5339207; ComponentLink3Description: LCSC Part URL; ComponentLink3URL: https://lcsc.com/product-detail/Inductors-SMD_YJYCOIN-YJYCOIN-YWLD1608-6R8K_C5339207.html
footprint IND-0603 (0603 (1608M) Inductor)
pins: 1, 2

## YWLD1608-100K
designator L?  Inductance: 10uH
Inductor, 10uH, ±10%, 2.4Ω, 280mA, SMD 0603; Manufacturer: YJYCOIN; Manufacturer Part Number: YWLD1608-100K; Self-Resonant Frequency: 36MHz; Q Factor: 14@2.5MHz; Package Size: 0603; JLCPCB Basic Part: No; JLCPCB Part Number: C5339208; Supplier 1: LCSC; Category: Inductors; Supplier Part Number 1: C5339208; Tolerance: ±10%; Rated Current: 280mA; DC Resistance: 2.4Ω; RoHS: Yes; ComponentLink1Description: Datasheet; ComponentLink1URL: https://wmsc.lcsc.com/wmsc/upload/file/pdf/v2/lcsc/2212271430_YJYCOIN-YWLD1608-100K_C5339208.pdf; ComponentLink2Description: JLCPCB Part URL; ComponentLink2URL: https://jlcpcb.com/partdetail/C5339208; ComponentLink3Description: LCSC Part URL; ComponentLink3URL: https://lcsc.com/product-detail/Inductors-SMD_YJYCOIN-YJYCOIN-YWLD1608-100K_C5339208.html
footprint IND-0603 (0603 (1608M) Inductor)
pins: 1, 2

## YWLD1608-150K
designator L?  Inductance: 15uH
Inductor, 15uH, ±10%, 3.38Ω, 220mA, SMD 0603; Manufacturer: YJYCOIN; Manufacturer Part Number: YWLD1608-150K; Self-Resonant Frequency: 29MHz; Q Factor: 14@2.5MHz; Package Size: 0603; JLCPCB Basic Part: No; JLCPCB Part Number: C5339209; Supplier 1: LCSC; Category: Inductors; Supplier Part Number 1: C5339209; Tolerance: ±10%; Rated Current: 220mA; DC Resistance: 3.38Ω; RoHS: Yes; ComponentLink1Description: Datasheet; ComponentLink1URL: https://wmsc.lcsc.com/wmsc/upload/file/pdf/v2/lcsc/2212271430_YJYCOIN-YWLD1608-150K_C5339209.pdf; ComponentLink2Description: JLCPCB Part URL; ComponentLink2URL: https://jlcpcb.com/partdetail/C5339209; ComponentLink3Description: LCSC Part URL; ComponentLink3URL: https://lcsc.com/product-detail/Inductors-SMD_YJYCOIN-YJYCOIN-YWLD1608-150K_C5339209.html
footprint IND-0603 (0603 (1608M) Inductor)
pins: 1, 2

## YWLD1608-220K
designator L?  Inductance: 22uH
Inductor, 22uH, ±10%, 4.69Ω, 200mA, SMD 0603; Manufacturer: YJYCOIN; Manufacturer Part Number: YWLD1608-220K; Self-Resonant Frequency: 24MHz; Q Factor: 14@2.5MHz; Package Size: 0603; JLCPCB Basic Part: No; JLCPCB Part Number: C5339210; Supplier 1: LCSC; Category: Inductors; Supplier Part Number 1: C5339210; Tolerance: ±10%; Rated Current: 200mA; DC Resistance: 4.69Ω; RoHS: Yes; ComponentLink1Description: Datasheet; ComponentLink1URL: https://wmsc.lcsc.com/wmsc/upload/file/pdf/v2/lcsc/2212271430_YJYCOIN-YWLD1608-220K_C5339210.pdf; ComponentLink2Description: JLCPCB Part URL; ComponentLink2URL: https://jlcpcb.com/partdetail/C5339210; ComponentLink3Description: LCSC Part URL; ComponentLink3URL: https://lcsc.com/product-detail/Inductors-SMD_YJYCOIN-YJYCOIN-YWLD1608-220K_C5339210.html
footprint IND-0603 (0603 (1608M) Inductor)
pins: 1, 2

## YWLD1608-330K
designator L?  Inductance: 33uH
Inductor, 33uH, ±10%, 8.58Ω, 120mA, SMD 0603; Manufacturer: YJYCOIN; Manufacturer Part Number: YWLD1608-330K; Self-Resonant Frequency: 15MHz; Q Factor: 14@2.5MHz; Package Size: 0603; JLCPCB Basic Part: No; JLCPCB Part Number: C5339211; Supplier 1: LCSC; Category: Inductors; Supplier Part Number 1: C5339211; Tolerance: ±10%; Rated Current: 120mA; DC Resistance: 8.58Ω; RoHS: Yes; ComponentLink1Description: Datasheet; ComponentLink1URL: https://wmsc.lcsc.com/wmsc/upload/file/pdf/v2/lcsc/2212271430_YJYCOIN-YWLD1608-330K_C5339211.pdf; ComponentLink2Description: JLCPCB Part URL; ComponentLink2URL: https://jlcpcb.com/partdetail/C5339211; ComponentLink3Description: LCSC Part URL; ComponentLink3URL: https://lcsc.com/product-detail/Inductors-SMD_YJYCOIN-YJYCOIN-YWLD1608-330K_C5339211.html
footprint IND-0603 (0603 (1608M) Inductor)
pins: 1, 2